# Altium footprint library SWLIB(150721).PcbLib: 348 footprints (part 4 of 22)
Each footprint in its own frame and in the unit in brackets; x right, y up, seen from the top. Pads: shape width x height; smd on the part's side, far side on the other; paste and mask are expansions set on the pad; w line width, h text height; cw(c..) or ccw(c..) is an arc to the next point about the centre after c.
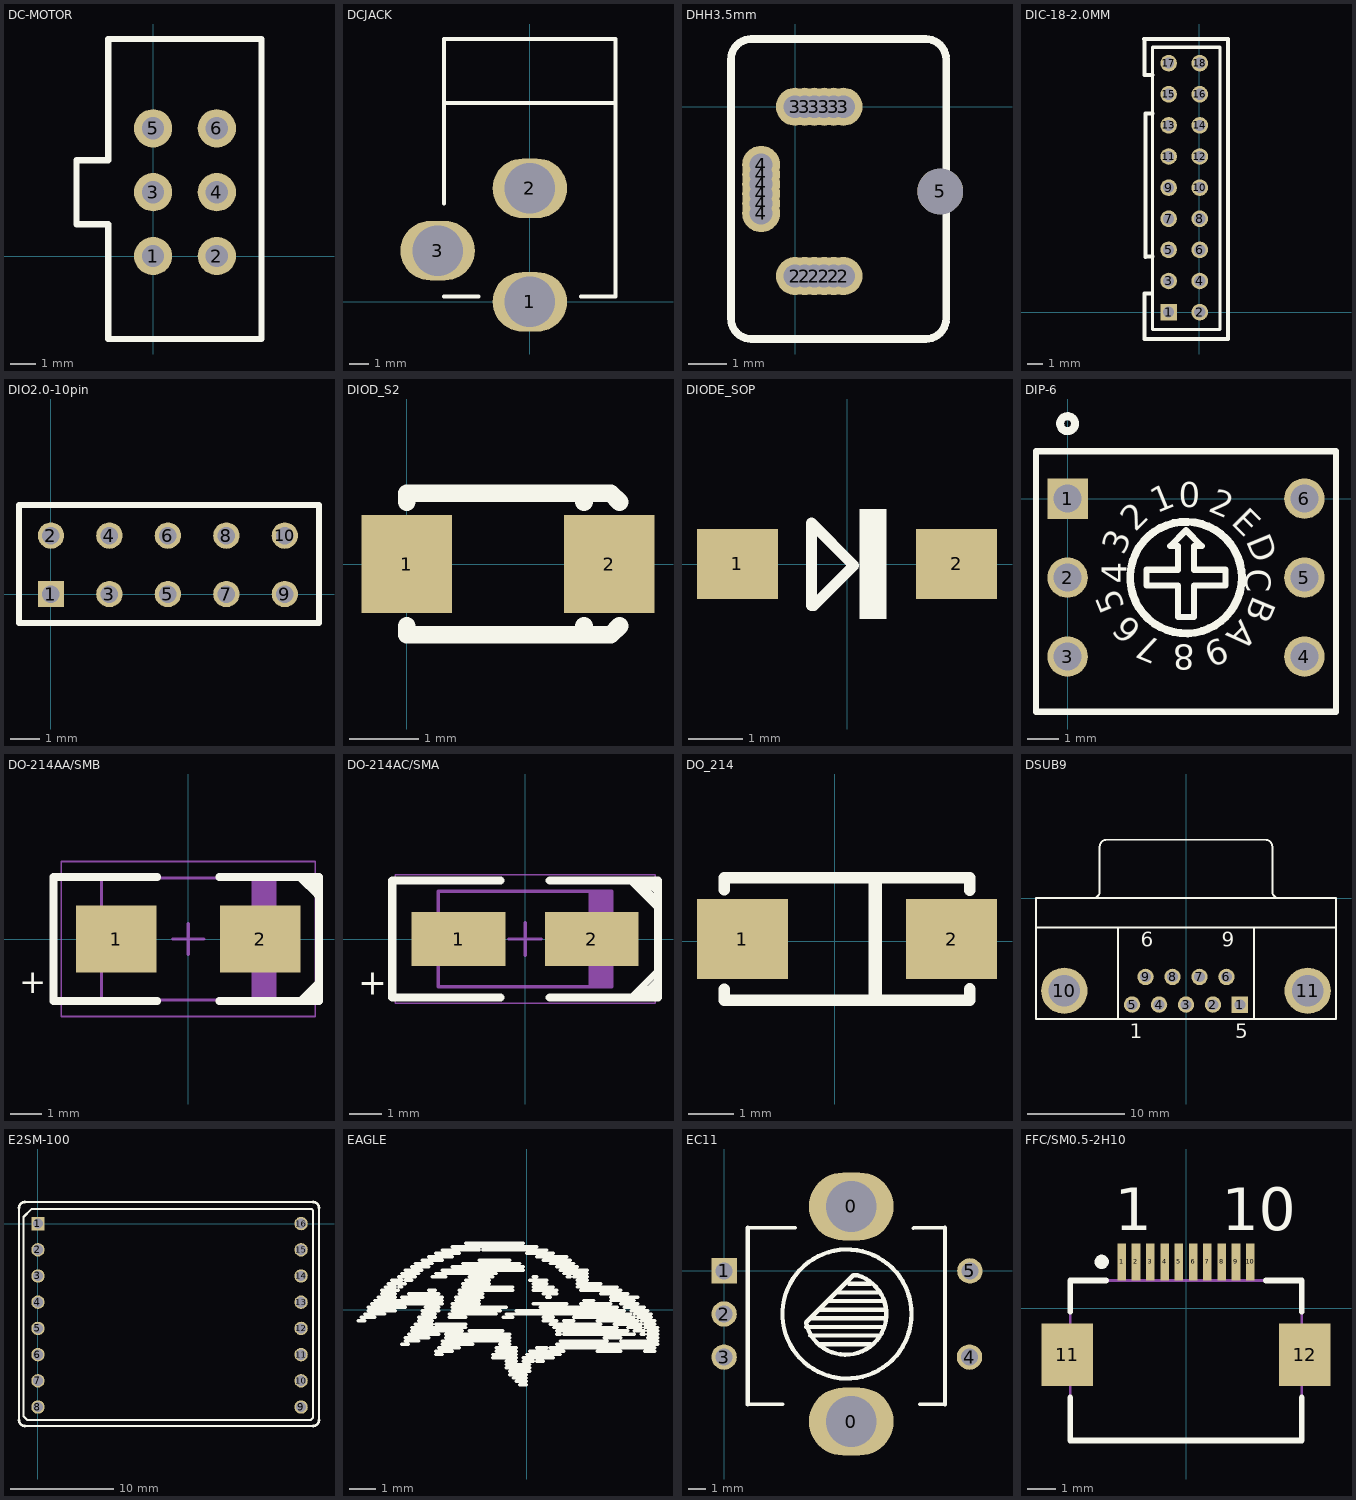
[diagram p3: the footprints below, top view; thin cyan lines are the x and y axes]

## DC-MOTOR [mil] "电脑鼠电机"
pads (6):
  round 60 hole 35: 1(0,0) 2(100,0) 3(0,100) 4(100,100) 5(0,200) 6(100,200)
Top Overlay:
  lines w10: -120,50 -120,150 -70,150 -70,340 170,340 170,250 170,-130 -70,-130 -70,50 -120,50

## DCJACK [mil]
pads (3):
  oval 150x120 hole 102: 1(0,0) 2(0,229) 3(-186,103)
Top Overlay:
  lines w8: -173,11 -103,11 ; -173,198 -173,530 173,530 173,11 103,11 ; -173,401 173,401

## DHH3.5mm [mm]
pads (19):
  round 1 hole 0.6: 2(0,-4.445) 2(0.254,-4.445) 2(0.508,-4.445) 2(0.762,-4.445) 2(1.016,-4.445) 2(1.27,-4.445) 3(0,0) 3(0.254,0) 3(0.508,0) 3(0.762,0) 3(1.016,0) 3(1.27,0) 4(-0.889,-2.794) 4(-0.889,-2.54) 4(-0.889,-2.286) 4(-0.889,-2.032) 4(-0.889,-1.778) 4(-0.889,-1.524)
  round 1.2 hole 1.2: 5(3.81,-2.222)
Top Overlay:
  lines w0.2: -1.682,-5.557 ccw(c-1.143,-5.557) -1.143,-6.096 3.429,-6.096 ccw(c3.429,-5.557) 3.968,-5.557 3.968,1.239 ccw(c3.429,1.239) 3.429,1.778 -1.143,1.778 ccw(c-1.143,1.239) -1.682,1.239 -1.682,-5.557
3D body: height 13, standoff 0, extent -0.58,-3.931 2.906,-0.438
3D body: height 12, standoff 0.1, extent -1.397,-5.791 3.708,1.422

## DIC-18-2.0MM [mil]
pads (18):
  rect 42x42 hole 28: 1(-78,0)
  round 42 hole 28: 2(0.74,0) 3(-78,78.74) 4(0.74,78.74) 5(-78,157.48) 6(0.74,157.48) 7(-78,236.22) 8(0.74,236.22) 9(-78,314.96) 10(0.74,314.96) 11(-78,393.7) 12(0.74,393.7) 13(-78,472.44) 14(0.74,472.44) 15(-78,551.18) 16(0.74,551.18) 17(-78,629.92) 18(0.74,629.92)
Top Overlay:
  lines w7.87: -119,-44 52,-44 52,670 -119,670 -119,-44
  lines w10: -140,691 72,691 72,-68 -138.43,-68 -138.43,47 -120,47 ; -139,691 -139,600 -119,600 ; -119,141 -135,141 -136,140 -136,503 -119,503
Bottom Overlay:
  text "1" at -54,-81 h30
  text "2" at 21,-78 h30
  text "17" at -63,746 h30
  text "18" at 21,743 h30

## DIO2.0-10pin [mm]
pads (10):
  rect 0.9x0.9 hole 0.6: 1(0,0)
  round 0.9 hole 0.6: 2(0,2) 3(2,0) 4(2,2) 5(4,0) 6(4,2) 7(6,0) 8(6,2) 9(8,0) 10(8,2)
Top Overlay:
  lines w0.2: -1.092,3.048 9.169,3.048 9.169,-0.991 -1.092,-0.991 -1.092,2.997 -1.041,3.048
3D body: height 8, standoff 0.1, extent -1.016,-0.762 9.144,2.794

## DIOD_S2 [mm]
pads (2):
  rect 1.3x1.4 smd: 1(0,0) 2(2.9,0)
Top Overlay:
  lines w0.254: 0,-0.889 0,-1.016 2.921,-1.016 3.048,-0.889 ; 0,0.889 0,1.016 2.921,1.016 3.048,0.889 ; 2.54,-1.016 2.54,-0.889 ; 2.54,0.889 2.54,1.016

## DIODE_SOP [mm]
pads (2):
  rect 1.5x1.3 smd: 1(-2.032,0) 2(2.032,0)
Top Overlay:
  rectangle: 0.229,-1.016 0.737,1.016
  lines w0.2: -0.66,-0.77 -0.66,0.762 0.127,-0.025 -0.617,-0.77 -0.66,-0.77
3D body: height 1.5, standoff 0.1, extent 1.575,-0.533 1.956,0.61
3D body: height 1.5, standoff 0.1, extent -2.21,-0.635 2.159,0.66

## DIP-6 [mm]
pads (6):
  rect 1.3x1.3 hole 0.9 mask+0.102: 1(0,0)
  round 1.3 hole 0.9 mask+0.102: 2(0,-2.54) 3(0,-5.08) 4(7.62,-5.08) 5(7.62,-2.54) 6(7.62,0)
Top Overlay:
  circle w0.254: c3.81,-2.54 r1.796
  circle w0.254: c0,2.413 r0.241
  lines w0.2: -1.016,-6.858 8.636,-6.858 8.636,1.524 -1.016,1.524 -1.016,-6.858 ; 2.54,-2.794 3.556,-2.794 3.556,-3.81 4.064,-3.81 4.064,-2.794 5.08,-2.794 5.08,-2.286 4.064,-2.286 4.064,-1.778 4.064,-1.524 4.318,-1.524 3.81,-1.016 3.302,-1.524 3.556,-1.524 3.556,-1.778 3.556,-2.286 2.54,-2.286 2.54,-2.794
  text "E" at 5.232,-0.787 h0.8
  text "D" at 5.74,-1.346 h0.8
  text "C" at 5.74,-2.261 h0.8
  text "B" at 5.994,-3.099 h0.8
  text "9" at 4.953,-4.445 h0.8
  text "7" at 3.073,-4.597 h0.8
  text "6" at 2.438,-4.191 h0.8
  text "2" at 4.496,-0.381 h0.8
  text "3" at 1.803,-1.854 h0.8
  text "5" at 1.854,-3.48 h0.8
  text "1" at 2.87,-0.483 h0.8
  text "4" at 1.905,-2.743 h0.8
  text "A" at 5.588,-3.861 h0.8
  text "2" at 2.184,-1.092 h0.8
  text "8" at 4.089,-4.699 h0.8
  text "0" at 3.581,-0.279 h0.8
3D body: height 5.5, standoff 0, extent 1.851,-4.587 5.835,-0.595
3D body: height 5, standoff 0.1, extent -0.025,-6.274 7.696,1.092

## DO-214AA/SMB [mm] "Molded Diode, 2-Leads, Body 5.33x3.62mm, IPC Low Density"
height 2.4
pads (2):
  rect 2.6x2.15 smd: 1(-2.325,0) 2(2.325,0)
Top Overlay:
  lines w0.2: 3.632,-2 3.632,-1.956 4.166,-1.422 ; 3.632,1.956 3.632,1.93 4.14,1.422 ; 3.937,-1.905 4.166,-1.676 ; 3.937,1.905 3.937,1.88 4.115,1.702
  lines w0.254: -1,-2 -4.343,-2 -4.343,2 -1,2 ; 1,-2 4.216,-2 4.216,2 1,2 ; 3,-2 3.2,-2
  text "+" at -5.461,-1.753 h0.76
Mechanical 13:
  rectangle: 2.043,-1.97 2.795,1.97
  lines w0.1: -2.795,-1.97 -2.795,1.97 2.795,1.97 2.795,-1.97 -2.795,-1.97
Mechanical 15:
  lines w0.05: -4.1,-2.5 -4.1,2.5 4.1,2.5 4.1,-2.5 -4.1,-2.5
  lines w0.1: -0.5,0 0.5,0 ; 0,-0.5 0,0.5
3D body "DO-214AA SMB.step": height 2.4, standoff 0.1, extent -2.725,-1.8 2.675,1.8

## DO-214AC/SMA [mm] "Molded Diode, 2-Leads, Body 5.03x2.69mm, IPC Low Density"
height 2.4
pads (2):
  rect 2.85x1.65 smd: 1(-2.025,0) 2(2.025,0)
Top Overlay:
  lines w0.2: 3.277,1.702 3.988,0.991 ; 3.302,-1.702 3.988,-1.016 ; 3.454,-1.702 3.581,-1.702 4.013,-1.27 ; 3.48,1.626 3.556,1.626 3.988,1.194 ; 3.734,1.676 3.785,1.676 3.962,1.499 ; 3.785,-1.702 3.937,-1.549
  lines w0.254: -0.75,-1.778 -4.039,-1.778 -4.039,1.778 -0.75,1.778 ; 0.75,-1.778 4.039,-1.778 4.039,1.778 0.75,1.778
  text "+" at -5.08,-1.702 h0.76
Mechanical 13:
  rectangle: 1.93,-1.45 2.64,1.45
  lines w0.1: -2.64,-1.45 -2.64,1.45 2.64,1.45 2.64,-1.45 -2.64,-1.45
Mechanical 15:
  lines w0.05: -3.95,-1.95 -3.95,1.95 3.95,1.95 3.95,-1.95 -3.95,-1.95
  lines w0.1: -0.5,0 0.5,0 ; 0,-0.5 0,0.5
3D body "DO-214AC SMA.step": height 2.4, standoff 0, extent -2.6,-1.3 2.6,1.3

## DO_214 [mm]
height 5.7
pads (2):
  rect 2x1.75 smd: 1(-2.032,0.051) 2(2.568,0.051)
Top Overlay:
  lines w0.254: -2.432,-1.054 -2.432,-1.299 2.968,-1.299 2.968,-1.049 ; -2.432,1.131 -2.432,1.401 2.963,1.401 ; 2.968,1.126 2.968,1.401
  lines w0.3: 0.888,-1.249 0.888,1.351
3D body "User Library-S1G.STEP": height 2.12, standoff -0.02, extent -2.23,-1.291 2.876,1.376

## DSUB9 [mm] "Connector; D Subminiature; 9 Position; Right Angle; Pitch 1.385 mm"
height 12.75
pads (11):
  rect 1.69x1.69 hole 1.09: 1(5.54,-10.92)
  round 1.69 hole 1.09: 2(2.77,-10.92) 3(0,-10.92) 4(-2.77,-10.92) 5(-5.54,-10.92) 6(4.155,-8.08) 7(1.385,-8.08) 8(-1.385,-8.08) 9(-4.155,-8.08)
  round 4.76 hole 3.26: 10(-12.495,-9.5) 11(12.495,-9.5)
Top Overlay:
  lines w0.2: -15.4,-3 15.4,-3 ; -9.56,0.005 ccw(c-9.56,0.7) -8.865,0.7 -8.865,5.3 ; -8.86,5.305 cw(c-8.165,5.305) -8.165,6 8.165,6 cw(c8.165,5.305) 8.86,5.305 ; -7,-12.4 -7,-3 ; 7,-12.4 7,-3 ; 8.865,5.3 8.865,0.7 ccw(c9.56,0.7) 9.56,0.005 ; -15.4,-12.4 15.4,-12.4 15.4,0 -15.4,0 -15.4,-12.4
  text "6" at -4.655,-4.975 h1.5
  text "9" at 3.655,-4.975 h1.5
  text "5" at 5.04,-14.375 h1.5
  text "1" at -5.79,-14.375 h1.5

## E2SM-100 [mm]
pads (16):
  rect 1.3x1.3 hole 1: 1(0,0)
  round 1.3 hole 1: 2(0,-2.54) 3(0,-5.08) 4(0,-7.62) 5(0,-10.16) 6(0,-12.7) 7(0,-15.24) 8(0,-17.78) 9(25.5,-17.78) 10(25.5,-15.24) 11(25.5,-12.7) 12(25.5,-10.16) 13(25.5,-7.62) 14(25.5,-5.08) 15(25.5,-2.54) 16(25.5,0)
Top Overlay:
  lines w0.2: -1.838,-19.05 -1.838,1.524 ; -1.27,-19.618 26.67,-19.618 ; -1.27,2.092 26.67,2.092 ; 27.238,-19.05 27.238,1.524 ; -1.397,-18.669 -1.016,-19.05 26.416,-19.05 26.67,-18.796 26.67,1.27 26.543,1.397 -0.635,1.397 -1.397,0.635 -1.397,-18.669
  lines w0.254: -1.838,-19.05 ccw(c-1.27,-19.05) -1.27,-19.618 ; -1.838,1.524 cw(c-1.27,1.524) -1.27,2.092 ; 26.67,-19.618 ccw(c26.67,-19.05) 27.238,-19.05 ; 26.67,2.092 cw(c26.67,1.524) 27.238,1.524
3D body: height 7, standoff 1, extent -1.829,-19.634 27.229,2.108

## EAGLE [mm]
Top Overlay:
  drawing of 151 lines, arcs and shapes, not listed

## EC11 [mm]
pads (7):
  oval 5x4 hole 3: 0(7.5,-8.89) 0(7.5,3.81)
  rect 1.5x1.5 hole 1: 1(0,0)
  round 1.5 hole 1: 2(0,-2.54) 3(0,-5.08) 4(14.478,-5.08) 5(14.5,0)
Top Overlay:
  circle w0.254: c7.25,-2.54 r3.807
  lines w0.2: 1.397,-7.874 3.454,-7.874 ; 1.397,2.54 4.191,2.54 ; 11.151,2.515 11.176,2.54 13.03,2.54 ; 11.532,-7.874 13.03,-7.874
  lines w0.254: 1.397,-7.874 1.397,2.54 ; 4.826,-3.302 9.398,-3.302 ; 5.08,-3.81 9.144,-3.81 ; 5.08,-2.794 9.398,-2.794 ; 5.588,-4.318 8.636,-4.318 ; 5.588,-2.286 9.398,-2.286 ; 6.096,-1.778 9.398,-1.778 ; 6.604,-1.27 9.144,-1.27 ; 7.366,-0.762 8.636,-0.762 ; 13.03,-7.874 13.03,2.54 ; 4.843,-3.091 ccw(c7.177,-2.546) 7.874,-0.254 7.62,-0.254 4.843,-3.031 4.843,-3.091
3D body: height 6, standoff 1, extent 3.378,-6.325 11.125,1.245
3D body: height 4, standoff 1, extent 1.257,-7.849 13.195,2.616

## FFC/SM0.5-2H10 [mm] "Connector; FH12 Series; 10 Position; 0.5mm Spaced Bottom Contact"
height 2
pads (12):
  rect 0.3x1.3 smd: 1(-2.25,1.625) 2(-1.75,1.625) 3(-1.25,1.625) 4(-0.75,1.625) 5(-0.25,1.625) 6(0.25,1.625) 7(0.75,1.625) 8(1.25,1.625) 9(1.75,1.625) 10(2.25,1.625)
  rect 1.8x2.2 smd: 11(-4.15,-1.625) 12(4.15,-1.625)
Top Overlay:
  circle w0.25: c-2.95,1.625 r0.125
  lines w0.2: -4.05,-3.125 -4.05,-4.625 4.05,-4.625 4.05,-3.125 ; -4.05,-0.125 -4.05,0.975 -2.8,0.975 ; 2.8,0.975 4.05,0.975 4.05,-0.125
  text "10" at 1.25,2.725 h1.5
  text "1" at -2.5,2.725 h1.5
Mechanical 13:
  lines w0.1: -4.05,-4.625 -4.05,0.975 4.05,0.975 4.05,-4.625 -4.05,-4.625
3D body: height 2, standoff 0, extent -4.05,-4.625 4.05,0.975